# Altium footprint library 19-Resistors.PcbLib: 199 footprints (part 6 of 13)
Each footprint in its own frame and in the unit in brackets; x right, y up, seen from the top. Pads: shape width x height; smd on the part's side, far side on the other; paste and mask are expansions set on the pad; w line width, h text height; cw(c..) or ccw(c..) is an arc to the next point about the centre after c.
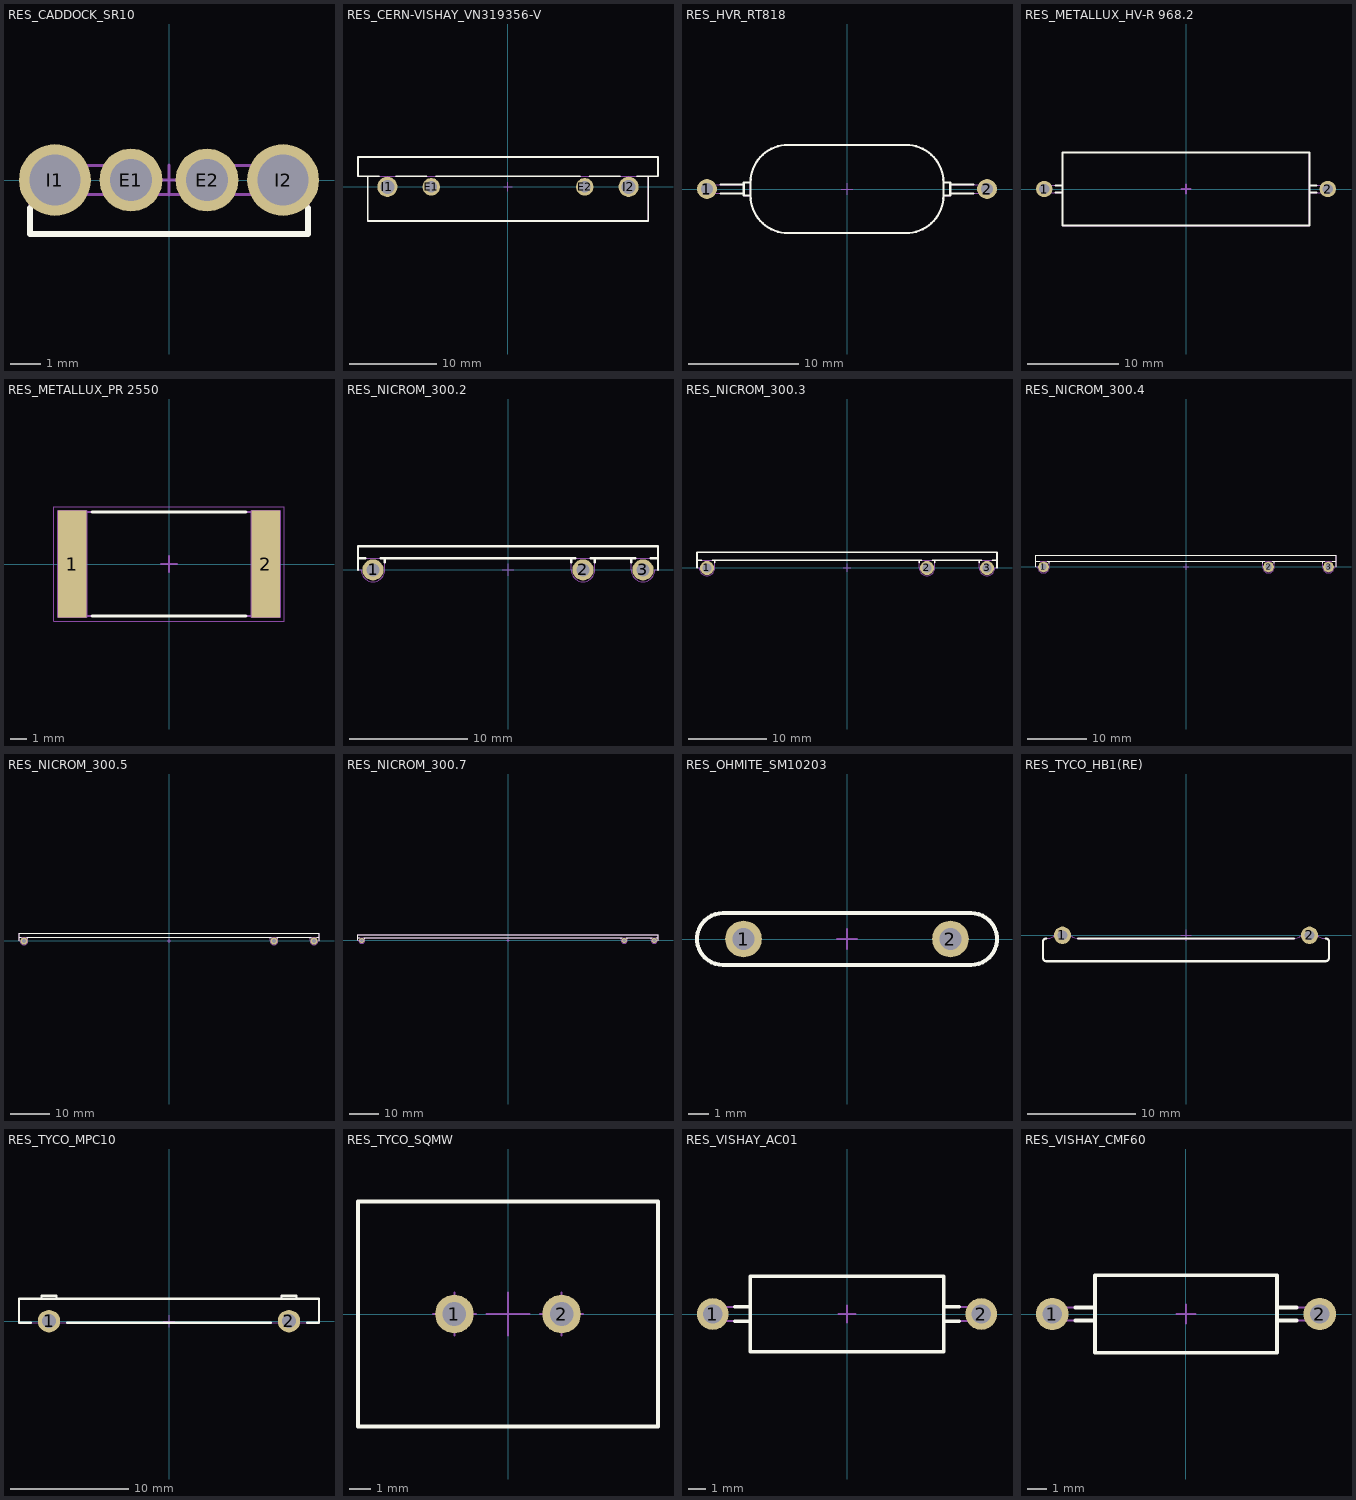
[diagram p5: the footprints below, top view; thin cyan lines are the x and y axes]

## RES_CADDOCK_SR10 [mm] "Precision Current Sense Resistor"
height 9.78
pads (4):
  round 2.1 hole 1.4: E1(-1.27,0) E2(1.27,0)
  round 2.4 hole 1.7: I1(-3.81,0) I2(3.81,0)
Top Overlay:
  lines w0.2: -4.635,-0.939 -4.635,-1.8 4.635,-1.8 4.635,-0.939
Mechanical 8:
  lines w0.1: -4.31,0 -3.81,0 ; -3.81,-0.5 -3.81,0 ; -3.81,0.5 -3.81,0 ; -3.31,0 -3.81,0 ; -1.77,0 -1.27,0 ; -1.27,-0.5 -1.27,0 ; -1.27,0.5 -1.27,0 ; -0.77,0 -1.27,0 ; -0.5,0 0,0 ; 0,-0.5 0,0 ; 0,0.5 0,0 ; 0.5,0 0,0 ; 0.77,0 1.27,0 ; 1.27,-0.5 1.27,0 ; 1.27,0.5 1.27,0 ; 1.77,0 1.27,0 ; 3.31,0 3.81,0 ; 3.81,-0.5 3.81,0 ; 3.81,0.5 3.81,0 ; 4.31,0 3.81,0
Mechanical 14:
  lines w0.1: -4.38,-0.49 -4.38,0.49 -0.95,0.49 -0.95,-0.49 ; 0.95,-0.49 0.95,0.49 4.38,0.49 4.38,-0.49 ; -4.635,-1.8 4.635,-1.8 4.635,-0.49 -4.635,-0.49 -4.635,-1.8
3D body "v200-130.stp": height 0.02, standoff -1.65, extent 2.81,-1 4.81,1
3D body "v200-130.stp": height 0.02, standoff -1.65, extent 0.27,-1 2.27,1
3D body "v200-130.stp": height 0.02, standoff -1.65, extent -2.27,-1 -0.27,1
3D body "v200-130.stp": height 0.02, standoff -1.65, extent -4.81,-1 -2.81,1
3D body "RES_CADDOCK_SR10.stp": height 9.87, standoff -3.6, extent -4.635,-1.8 4.635,0.49

## RES_CERN-VISHAY_VN319356-V [mm] "Custom Made Product VISHAY High Stability Precision Shunt Resistor"
height 25.2
pads (4):
  round 2 hole 1.3: E1(-8.75,0) E2(8.75,0)
  round 2.3 hole 1.6: I1(-13.75,0) I2(13.75,0)
Top Overlay:
  lines w0.2: -16,1.2 -16,-3.9 16,-3.9 16,1.2 ; -14.7,1.2 -17.1,1.2 -17.1,3.4 17.1,3.4 17.1,1.2 14.7,1.2 ; -12.8,1.2 -9.25,1.2 ; -8.25,1.2 8.25,1.2 ; 9.25,1.2 12.8,1.2
Mechanical 8:
  lines w0.1: -14.25,0 -13.75,0 ; -13.75,-0.5 -13.75,0 ; -13.75,0.5 -13.75,0 ; -13.25,0 -13.75,0 ; -9.25,0 -8.75,0 ; -8.75,-0.5 -8.75,0 ; -8.75,0.5 -8.75,0 ; -8.25,0 -8.75,0 ; -0.5,0 0,0 ; 0,-0.5 0,0 ; 0,0.5 0,0 ; 0.5,0 0,0 ; 8.25,0 8.75,0 ; 8.75,-0.5 8.75,0 ; 8.75,0.5 8.75,0 ; 9.25,0 8.75,0 ; 13.25,0 13.75,0 ; 13.75,-0.5 13.75,0 ; 13.75,0.5 13.75,0 ; 14.25,0 13.75,0
Mechanical 14:
  lines w0.1: -17.1,1.2 -17.1,3.4 17.1,3.4 17.1,1.2 -17.1,1.2 ; -16,-3.9 -16,1.2 16,1.2 16,-3.9 -16,-3.9
3D body "v200-130.stp": height 0.02, standoff -1.65, extent 12.75,-1 14.75,1
3D body "v200-130.stp": height 0.02, standoff -1.65, extent 7.75,-1 9.75,1
3D body "v200-130.stp": height 0.02, standoff -1.65, extent -9.75,-1 -7.75,1
3D body "v200-130.stp": height 0.02, standoff -1.65, extent -14.75,-1 -12.75,1
3D body "RES_CERN-VISHAY_VN319356-v.stp": height 25.2, standoff -3.8, extent -17.1,-3.9 17.1,3.4

## RES_HVR_RT818 [mm] "Resistor, Axial, Pad spacing 25.4mm - Body L 18.5mm X D 8mm Lead Diameter 0.812mm"
height 8
pads (2):
  round 1.8 hole 1.1: 1(-12.7,0) 2(12.7,0)
Top Overlay:
  lines w0.2: -11.465,-0.406 -9.365,-0.406 ; -11.465,0.406 -9.365,0.406 ; 9.365,-0.406 11.465,-0.406 ; 9.365,0.406 11.465,0.406 ; -8.75,-0.6 ccw(c-5.35,-0.6) -5.35,-4 5.35,-4 ccw(c5.35,-0.6) 8.75,-0.6 ; -8.75,-0.6 -9.365,-0.6 -9.365,0.6 -8.75,0.6 ; -8.75,-0.6 -8.75,0.6 ; -8.75,0.6 cw(c-5.35,0.6) -5.35,4 5.35,4 cw(c5.35,0.6) 8.75,0.6 ; 8.75,-0.6 9.365,-0.6 9.365,0.6 8.75,0.6 ; 8.75,-0.6 8.75,0.6
Mechanical 8:
  lines w0.1: -13.2,0 -12.7,0 ; -12.7,-0.5 -12.7,0 ; -12.7,0.5 -12.7,0 ; -12.2,0 -12.7,0 ; -0.5,0 0,0 ; 0,-0.5 0,0 ; 0,0.5 0,0 ; 0.5,0 0,0 ; 12.2,0 12.7,0 ; 12.7,-0.5 12.7,0 ; 12.7,0.5 12.7,0 ; 13.2,0 12.7,0
Mechanical 14:
  lines w0.1: -9.365,-0.406 -12.7,-0.406 cw(c-12.7,0) -12.7,0.406 -9.365,0.406 ; 9.365,-0.406 12.7,-0.406 ccw(c12.7,0) 12.7,0.406 9.365,0.406 ; -8.75,-0.6 ccw(c-5.35,-0.6) -5.35,-4 5.35,-4 ccw(c5.35,-0.6) 8.75,-0.6 ; -8.75,-0.6 -9.365,-0.6 -9.365,0.6 -8.75,0.6 ; -8.75,-0.6 -8.75,0.6 ; -8.75,0.6 cw(c-5.35,0.6) -5.35,4 5.35,4 cw(c5.35,0.6) 8.75,0.6 ; 8.75,-0.6 9.365,-0.6 9.365,0.6 8.75,0.6 ; 8.75,-0.6 8.75,0.6
3D body "v200-130.stp": height 0.02, standoff -1.65, extent 11.7,-1 13.7,1
3D body "v200-130.stp": height 0.02, standoff -1.65, extent -13.7,-1 -11.7,1
3D body "RES_HVR_RT818.stp": height 8, standoff -3.6, extent -13.106,-4 13.106,4

## RES_METALLUX_HV-R 968.2 [mm] "Resistor, Axial, Pad Spacing 31mm - Body Lengh 27mm X Body Diameter 8mm"
height 8
pads (2):
  round 1.8 hole 1.1: 1(-15.5,0) 2(15.5,0)
Top Overlay:
  lines w0.2: -14.275,-0.4 -13.5,-0.4 ; -14.275,0.4 -13.5,0.4 ; 13.5,-0.4 14.275,-0.4 ; 13.5,0.4 14.275,0.4 ; -13.5,-4 -13.5,4 13.5,4 13.5,-4 -13.5,-4
Mechanical 8:
  lines w0.2: -16,0 -15.5,0 ; -15.5,-0.5 -15.5,0 ; -15.5,0.5 -15.5,0 ; -15,0 -15.5,0 ; -0.5,0 0,0 ; 0,-0.5 0,0 ; 0,0.5 0,0 ; 0.5,0 0,0 ; 15,0 15.5,0 ; 15.5,-0.5 15.5,0 ; 15.5,0.5 15.5,0 ; 16,0 15.5,0
Mechanical 14:
  lines w0.1: -13.5,-0.4 -15.5,-0.4 cw(c-15.5,0) -15.5,0.4 -13.5,0.4 ; 13.5,-0.4 15.5,-0.4 ccw(c15.5,0) 15.5,0.4 13.5,0.4 ; -13.5,-4 -13.5,4 13.5,4 13.5,-4 -13.5,-4
3D body "v200-130.stp": height 0.02, standoff -1.65, extent 14.5,-1 16.5,1
3D body "v200-130.stp": height 0.02, standoff -1.65, extent -16.5,-1 -14.5,1
3D body "RES_METALLUX_HV-R 968.2.stp": height 8, standoff -3.6, extent -15.9,-4 15.9,4

## RES_METALLUX_PR 2550 [mm] "High Voltage Resistor SMD Resistor, 2-Leads, Body 12.7 x 6.35 mm, IPC Medium Density"
height 1.52
pads (2):
  rect 1.75x6.5 smd: 1(-5.9,0) 2(5.9,0)
Top Overlay:
  lines w0.2: -4.68,-3.175 4.68,-3.175 ; -4.68,3.175 4.68,3.175
Mechanical 8:
  lines w0.1: -6.4,0 -5.9,0 ; -5.9,-0.5 -5.9,0 ; -5.9,0.5 -5.9,0 ; -5.4,0 -5.9,0 ; -0.5,0 0,0 ; 0,-0.5 0,0 ; 0,0.5 0,0 ; 0.5,0 0,0 ; 5.4,0 5.9,0 ; 5.9,-0.5 5.9,0 ; 5.9,0.5 5.9,0 ; 6.4,0 5.9,0 ; -6.775,-3.25 -5.025,-3.25 -5.025,3.25 -6.775,3.25 -6.775,-3.25 ; 5.025,-3.25 6.775,-3.25 6.775,3.25 5.025,3.25 5.025,-3.25
Mechanical 14:
  lines w0.1: -6.35,-3.175 -6.35,3.175 ; -6.35,-3.175 -5.08,-3.175 -5.08,3.175 -6.35,3.175 ; -6.35,-3.175 6.35,-3.175 ; -6.35,-3.175 -6.35,3.175 ; -6.35,3.175 6.35,3.175 ; 6.35,-3.175 5.08,-3.175 5.08,3.175 6.35,3.175 ; 6.35,-3.175 6.35,3.175 ; 6.35,-3.175 6.35,3.175
Mechanical 15:
  lines w0.05: -7.025,-3.5 -7.025,3.5 7.025,3.5 7.025,-3.5 -7.025,-3.5
3D body "p650-175.stp": height 0.02, standoff 0, extent -6.8,-3.25 -5.05,3.25
3D body "p650-175.stp": height 0.02, standoff 0, extent 5.05,-3.25 6.8,3.25
3D body "RES_METALLUX_PR 2550.stp": height 1.52, standoff 0, extent -6.35,-3.175 6.35,3.175

## RES_NICROM_300.2 [mm] "High Voltage Divider NICROM 300.2"
height 7.62
pads (3):
  round 1.8 hole 1.1: 1(-11.43,0) 2(6.35,0) 3(11.43,0)
Top Overlay:
  lines w0.2: -12.7,0 -12.7,1 ; -12.093,1 -12.7,1 ; -10.767,1 5.687,1 ; -10.43,0.663 -10.43,1 ; 5.35,0.663 5.35,1 ; 7.013,1 10.767,1 ; 7.35,0.663 7.35,1 ; 10.43,0.663 10.43,1 ; 12.093,1 12.7,1 ; 12.7,0 12.7,1 ; -12.7,1 -12.7,2 ; -12.7,1 -12.7,2 ; -12.7,2 12.7,2 12.7,1
Mechanical 8:
  lines w0.1: -11.93,0 -11.43,0 ; -11.43,-0.5 -11.43,0 ; -11.43,0.5 -11.43,0 ; -10.93,0 -11.43,0 ; -0.5,0 0,0 ; 0,-0.5 0,0 ; 0,0.5 0,0 ; 0.5,0 0,0 ; 5.85,0 6.35,0 ; 6.35,-0.5 6.35,0 ; 6.35,0.5 6.35,0 ; 6.85,0 6.35,0 ; 10.93,0 11.43,0 ; 11.43,-0.5 11.43,0 ; 11.43,0.5 11.43,0 ; 11.93,0 11.43,0
Mechanical 14:
  lines w0.1: -10.43,1 -10.43,0 cw(c-11.43,0) -12.43,0 ; 5.35,1 5.35,0 ccw(c6.35,0) 7.35,0 7.35,1 ; 10.43,1 10.43,0 ccw(c11.43,0) 12.43,0 12.7,0 12.7,1 ; -12.7,0 -12.43,0 ; -12.7,0 -12.7,1 ; -12.7,0 -12.43,0 ; -12.7,1 -12.7,2 12.7,2 12.7,1 ; -12.7,1 12.7,1
3D body "v200-130.stp": height 0.02, standoff -1.65, extent 10.43,-1 12.43,1
3D body "v200-130.stp": height 0.02, standoff -1.65, extent 5.35,-1 7.35,1
3D body "v200-130.stp": height 0.02, standoff -1.65, extent -12.43,-1 -10.43,1
3D body "RES_NICROM_300.2.stp": height 12.62, standoff -3.6, extent -12.7,-1 12.7,2

## RES_NICROM_300.3 [mm] "High Voltage Divider NICROM 300.3"
height 12.7
pads (3):
  round 1.8 hole 1.1: 1(-17.78,0) 2(10.16,0) 3(17.78,0)
Top Overlay:
  lines w0.2: -19.05,0 -19.05,1 ; -18.443,1 -19.05,1 ; -17.117,1 9.497,1 ; -16.78,0.663 -16.78,1 ; 9.16,0.663 9.16,1 ; 10.823,1 17.117,1 ; 11.16,0.663 11.16,1 ; 16.78,0.663 16.78,1 ; 18.443,1 19.05,1 ; 19.05,0 19.05,1 ; -19.05,1 -19.05,2 ; -19.05,1 -19.05,2 ; -19.05,2 19.05,2 19.05,1
Mechanical 8:
  lines w0.1: -18.28,0 -17.78,0 ; -17.78,-0.5 -17.78,0 ; -17.78,0.5 -17.78,0 ; -17.28,0 -17.78,0 ; -0.5,0 0,0 ; 0,-0.5 0,0 ; 0,0.5 0,0 ; 0.5,0 0,0 ; 9.66,0 10.16,0 ; 10.16,-0.5 10.16,0 ; 10.16,0.5 10.16,0 ; 10.66,0 10.16,0 ; 17.28,0 17.78,0 ; 17.78,-0.5 17.78,0 ; 17.78,0.5 17.78,0 ; 18.28,0 17.78,0
Mechanical 14:
  lines w0.1: -16.78,1 -16.78,0 cw(c-17.78,0) -18.78,0 ; 9.16,1 9.16,0 ccw(c10.16,0) 11.16,0 11.16,1 ; 16.78,1 16.78,0 ccw(c17.78,0) 18.78,0 19.05,0 19.05,1 ; -19.05,0 -18.78,0 ; -19.05,0 -19.05,1 ; -19.05,0 -18.78,0 ; -19.05,1 -19.05,2 ; -19.05,1 -19.05,2 ; -19.05,1 19.05,1 ; -19.05,2 19.05,2 ; 19.05,1 19.05,2 ; 19.05,1 19.05,2
3D body "v200-130.stp": height 0.02, standoff -1.65, extent 16.78,-1 18.78,1
3D body "v200-130.stp": height 0.02, standoff -1.65, extent 9.16,-1 11.16,1
3D body "v200-130.stp": height 0.02, standoff -1.65, extent -18.78,-1 -16.78,1
3D body "RES_NICROM_300.3.stp": height 17.7, standoff -3.6, extent -19.05,-1 19.05,2

## RES_NICROM_300.4 [mm] "High Voltage Divider NICROM 300.4"
height 15.24
pads (3):
  round 1.8 hole 1.1: 1(-24.13,0) 2(13.97,0) 3(24.13,0)
Top Overlay:
  lines w0.2: -25.4,0 -25.4,1 ; -24.793,1 -25.4,1 ; -23.467,1 13.307,1 ; -23.13,0.663 -23.13,1 ; 12.97,0.663 12.97,1 ; 14.633,1 23.467,1 ; 14.97,0.663 14.97,1 ; 23.13,0.663 23.13,1 ; 24.793,1 25.4,1 ; 25.4,0 25.4,1 ; -25.4,1 -25.4,2 ; -25.4,1 -25.4,2 ; -25.4,2 25.4,2 25.4,1
Mechanical 8:
  lines w0.1: -24.63,0 -24.13,0 ; -24.13,-0.5 -24.13,0 ; -24.13,0.5 -24.13,0 ; -23.63,0 -24.13,0 ; -0.5,0 0,0 ; 0,-0.5 0,0 ; 0,0.5 0,0 ; 0.5,0 0,0 ; 13.47,0 13.97,0 ; 13.97,-0.5 13.97,0 ; 13.97,0.5 13.97,0 ; 14.47,0 13.97,0 ; 23.63,0 24.13,0 ; 24.13,-0.5 24.13,0 ; 24.13,0.5 24.13,0 ; 24.63,0 24.13,0
Mechanical 14:
  lines w0.1: -23.13,1 -23.13,0 cw(c-24.13,0) -25.13,0 ; 12.97,1 12.97,0 ccw(c13.97,0) 14.97,0 14.97,1 ; 23.13,1 23.13,0 ccw(c24.13,0) 25.13,0 25.4,0 25.4,1 ; -25.4,0 -25.13,0 ; -25.4,0 -25.4,1 ; -25.4,0 -25.13,0 ; -25.4,1 -25.4,2 ; -25.4,1 -25.4,2 ; -25.4,1 25.4,1 ; -25.4,2 25.4,2 ; 25.4,1 25.4,2 ; 25.4,1 25.4,2
3D body "v200-130.stp": height 0.02, standoff -1.65, extent 23.13,-1 25.13,1
3D body "v200-130.stp": height 0.02, standoff -1.65, extent 12.97,-1 14.97,1
3D body "v200-130.stp": height 0.02, standoff -1.65, extent -25.13,-1 -23.13,1
3D body "RES_NICROM_300.4.stp": height 20.24, standoff -3.6, extent -25.4,-0.992 25.4,2

## RES_NICROM_300.5 [mm] "High Voltage Divider NICROM 300.5"
height 15.24
pads (3):
  round 1.8 hole 1.1: 1(-36.83,0) 2(26.67,0) 3(36.83,0)
Top Overlay:
  lines w0.2: -38.1,0 -38.1,1 ; -37.493,1 -38.1,1 ; -36.167,1 26.007,1 ; -35.83,0.663 -35.83,1 ; 25.67,0.663 25.67,1 ; 27.333,1 36.167,1 ; 27.67,0.663 27.67,1 ; 35.83,0.663 35.83,1 ; 37.493,1 38.1,1 ; 38.1,0 38.1,1 ; -38.1,1 -38.1,2 ; -38.1,1 -38.1,2 ; -38.1,2 38.1,2 38.1,1
Mechanical 8:
  lines w0.1: -37.33,0 -36.83,0 ; -36.83,-0.5 -36.83,0 ; -36.83,0.5 -36.83,0 ; -36.33,0 -36.83,0 ; -0.5,0 0,0 ; 0,-0.5 0,0 ; 0,0.5 0,0 ; 0.5,0 0,0 ; 26.17,0 26.67,0 ; 26.67,-0.5 26.67,0 ; 26.67,0.5 26.67,0 ; 27.17,0 26.67,0 ; 36.33,0 36.83,0 ; 36.83,-0.5 36.83,0 ; 36.83,0.5 36.83,0 ; 37.33,0 36.83,0
Mechanical 14:
  lines w0.1: -35.83,1 -35.83,0 cw(c-36.83,0) -37.83,0 ; 25.67,1 25.67,0 ccw(c26.67,0) 27.67,0 27.67,1 ; 35.83,1 35.83,0 ccw(c36.83,0) 37.83,0 38.1,0 38.1,1 ; -38.1,0 -37.83,0 ; -38.1,0 -38.1,1 ; -38.1,0 -37.83,0 ; -38.1,1 38.1,1 ; -38.1,1 -38.1,2 ; -38.1,1 -38.1,2 ; -38.1,2 38.1,2 ; 38.1,1 38.1,2 ; 38.1,1 38.1,2
3D body "v200-130.stp": height 0.02, standoff -1.65, extent 35.83,-1 37.83,1
3D body "v200-130.stp": height 0.02, standoff -1.65, extent 25.67,-1 27.67,1
3D body "v200-130.stp": height 0.02, standoff -1.65, extent -37.83,-1 -35.83,1
3D body "RES_NICROM_300.5.stp": height 20.24, standoff -3.6, extent -38.1,-1 38.1,2

## RES_NICROM_300.7 [mm] "High Voltage Divider NICROM 300.7"
height 15.24
pads (3):
  round 1.8 hole 1.1: 1(-49.53,0) 2(39.37,0) 3(49.53,0)
Top Overlay:
  lines w0.2: -50.8,0 -50.8,1 ; -50.193,1 -50.8,1 ; -48.867,1 38.707,1 ; -48.53,0.663 -48.53,1 ; 38.37,0.663 38.37,1 ; 40.033,1 48.867,1 ; 40.37,0.663 40.37,1 ; 48.53,0.663 48.53,1 ; 50.193,1 50.8,1 ; 50.8,0 50.8,1 ; -50.8,1 -50.8,2 ; -50.8,1 -50.8,2 ; -50.8,2 50.8,2 50.8,1
Mechanical 8:
  lines w0.1: -50.03,0 -49.53,0 ; -49.53,-0.5 -49.53,0 ; -49.53,0.5 -49.53,0 ; -49.03,0 -49.53,0 ; -0.5,0 0,0 ; 0,-0.5 0,0 ; 0,0.5 0,0 ; 0.5,0 0,0 ; 38.87,0 39.37,0 ; 39.37,-0.5 39.37,0 ; 39.37,0.5 39.37,0 ; 39.87,0 39.37,0 ; 49.03,0 49.53,0 ; 49.53,-0.5 49.53,0 ; 49.53,0.5 49.53,0 ; 50.03,0 49.53,0
Mechanical 14:
  lines w0.1: -48.53,1 -48.53,0 cw(c-49.53,0) -50.53,0 ; 38.37,1 38.37,0 ccw(c39.37,0) 40.37,0 40.37,1 ; 48.53,1 48.53,0 ccw(c49.53,0) 50.53,0 50.8,0 50.8,1 ; -50.8,0 -50.53,0 ; -50.8,0 -50.8,1 ; -50.8,0 -50.53,0 ; -50.8,1 50.8,1 ; -50.8,1 -50.8,2 ; -50.8,1 -50.8,2 ; -50.8,2 50.8,2 ; 50.8,1 50.8,2 ; 50.8,1 50.8,2
3D body "v200-130.stp": height 0.02, standoff -1.65, extent 48.53,-1 50.53,1
3D body "v200-130.stp": height 0.02, standoff -1.65, extent 38.37,-1 40.37,1
3D body "v200-130.stp": height 0.02, standoff -1.65, extent -50.425,-0.95 -48.425,1.05
3D body "RES_NICROM_300.7.stp": height 20.24, standoff -3.6, extent -50.8,-1 50.8,2

## RES_OHMITE_SM10203 [mm] "Resistor, Radial, Pad spacing 10.16mm - Body 14.73mm X 2.54mm X 8.64mm H"
height 8.64
pads (2):
  round 1.8 hole 1.1: 1(-5.08,0) 2(5.08,0)
Top Overlay:
  lines w0.2: -6.095,-1.27 cw(c-6.095,0) -6.095,1.27 6.095,1.27 cw(c6.095,0) 6.095,-1.27 -6.095,-1.27
Mechanical 8:
  lines w0.1: -5.58,0 -5.08,0 ; -5.08,-0.5 -5.08,0 ; -5.08,0.5 -5.08,0 ; -4.58,0 -5.08,0 ; -0.5,0 0,0 ; 0,-0.5 0,0 ; 0,0.5 0,0 ; 0.5,0 0,0 ; 4.58,0 5.08,0 ; 5.08,-0.5 5.08,0 ; 5.08,0.5 5.08,0 ; 5.58,0 5.08,0
Mechanical 14:
  lines w0.1: -6.095,-1.27 cw(c-6.095,0) -6.095,1.27 6.095,1.27 cw(c6.095,0) 6.095,-1.27 -6.095,-1.27
3D body "v200-130.stp": height 0.02, standoff -1.65, extent 4.08,-1 6.08,1
3D body "v200-130.stp": height 0.02, standoff -1.65, extent -6.08,-1 -4.08,1
3D body "RES_OHMITE_SM10203.stp": height 9.14, standoff -3.6, extent -7.365,-1.27 7.365,1.27

## RES_TYCO_HB1(RE) [mm] "Resistor, Radial, Leads spacing 22.9mm - Body 26.5mm X 3mm X 10.4mm H"
height 10.4
pads (2):
  round 1.6 hole 0.9: 1(-11.45,0) 2(11.45,0)
Top Overlay:
  lines w0.2: -12.95,-0.3 ccw(c-12.95,-0.6) -13.25,-0.6 -13.25,-2.1 ccw(c-12.95,-2.1) -12.95,-2.4 12.95,-2.4 ccw(c12.95,-2.1) 13.25,-2.1 13.25,-0.6 ccw(c12.95,-0.6) 12.95,-0.3 ; -10.011,-0.3 10.011,-0.3
Mechanical 8:
  lines w0.1: -11.95,0 -11.45,0 ; -11.45,-0.5 -11.45,0 ; -11.45,0.5 -11.45,0 ; -10.95,0 -11.45,0 ; -0.5,0 0,0 ; 0,-0.5 0,0 ; 0,0.5 0,0 ; 0.5,0 0,0 ; 10.95,0 11.45,0 ; 11.45,-0.5 11.45,0 ; 11.45,0.5 11.45,0 ; 11.95,0 11.45,0
Mechanical 14:
  lines w0.1: 11.983,0.259 ccw(c11.446,0.007) 10.91,0.263 cw(c10.011,0.7) 10.011,-0.3 -10.011,-0.3 cw(c-10.011,0.7) -10.91,0.263 ccw(c-11.45,0) -11.99,0.263 cw(c-12.893,0.704) -12.95,-0.3 ccw(c-12.95,-0.6) -13.25,-0.6 -13.25,-2.1 ccw(c-12.95,-2.1) -12.95,-2.4 12.95,-2.4 ccw(c12.95,-2.1) 13.25,-2.1 13.25,-0.6 ccw(c12.95,-0.6) 12.95,-0.3 cw(c12.893,0.704) 11.99,0.263
3D body "v200-130.stp": height 0.02, standoff -1.65, extent 10.45,-1 12.45,1
3D body "v200-130.stp": height 0.02, standoff -1.65, extent -12.45,-1 -10.45,1
3D body "RES_TYCO_HB1(RE).stp": height 18.4, standoff -2.1, extent -13.25,-2.4 13.25,0.6

## RES_TYCO_MPC10 [mm] "Resistor, Radial, Leads spacing 20.32mm - Body 25.4mm X 2.54mm X 27.68mm H"
height 27.68
pads (2):
  round 1.9 hole 1.2: 1(-10.16,0) 2(10.16,0)
Top Overlay:
  lines w0.2: -11.705,-0.127 -12.7,-0.127 -12.7,1.905 12.7,1.905 12.7,-0.127 11.705,-0.127 ; -10.795,1.905 -10.795,2.159 -9.525,2.159 -9.525,1.905 ; -8.615,-0.127 8.615,-0.127 ; 9.525,1.905 9.525,2.159 10.795,2.159 10.795,1.905
Mechanical 8:
  lines w0.1: -10.66,0 -10.16,0 ; -10.16,-0.5 -10.16,0 ; -10.16,0.5 -10.16,0 ; -9.66,0 -10.16,0 ; -0.5,0 0,0 ; 0,-0.5 0,0 ; 0,0.5 0,0 ; 0.5,0 0,0 ; 9.66,0 10.16,0 ; 10.16,-0.5 10.16,0 ; 10.16,0.5 10.16,0 ; 10.66,0 10.16,0
Mechanical 14:
  lines w0.1: -10.795,-0.127 -10.795,-0.381 -9.525,-0.381 -9.525,-0.127 ; -10.795,1.905 -10.795,2.159 -9.525,2.159 -9.525,1.905 ; 9.525,-0.127 9.525,-0.381 10.795,-0.381 10.795,-0.127 ; 9.525,1.905 9.525,2.159 10.795,2.159 10.795,1.905 ; -12.7,-0.127 -12.7,1.905 12.7,1.905 12.7,-0.127 -12.7,-0.127
3D body "v200-130.stp": height 0.02, standoff -1.65, extent 9.16,-1 11.16,1
3D body "v200-130.stp": height 0.02, standoff -1.65, extent -11.16,-1 -9.16,1
3D body "RES_TYCO_MPC10.stp": height 27.68, standoff -3.17, extent -12.7,-0.381 12.7,2.159

## RES_TYCO_SQMW [mm] "Resistor, Radial, Pad spacing 5mm - Body 14mm X 10.5mm X 40mm H"
height 40
pads (2):
  round 1.8 hole 1.1: 1(-2.5,0) 2(2.5,0)
Top Overlay:
  lines w0.2: -7,-5.25 7,-5.25 7,5.25 -7,5.25 -7,-5.25
Mechanical 8:
  lines w0.1: -3.5,0 -2.5,0 ; -2.5,-1 -2.5,0 ; -2.5,1 -2.5,0 ; -1.5,0 -2.5,0 ; -1,0 0,0 ; 0,-1 0,0 ; 0,1 0,0 ; 1,0 0,0 ; 1.5,0 2.5,0 ; 2.5,-1 2.5,0 ; 2.5,1 2.5,0 ; 3.5,0 2.5,0
Mechanical 14:
  lines w0.1: -7,-5.25 7,-5.25 7,5.25 -7,5.25 -7,-5.25
3D body "v200-130.stp": height 0.02, standoff -1.65, extent 1.5,-1 3.5,1
3D body "v200-130.stp": height 0.02, standoff -1.65, extent -3.5,-1 -1.5,1
3D body "RES_TYCO_SQMW.stp": height 40, standoff -3.5, extent -7,-5.25 7,5.25

## RES_VISHAY_AC01 [mm] "Resistor, Axial, Pad spacing 15.24 mm - Body Lengh 11mm X Body Diameter 4.3mm"
height 4.3
pads (2):
  round 1.8 hole 1.1: 1(-7.62,0) 2(7.62,0)
Top Overlay:
  lines w0.2: -6.383,-0.4 -5.5,-0.4 ; -6.383,0.4 -5.5,0.4 ; 5.5,-0.4 6.383,-0.4 ; 5.5,0.4 6.383,0.4 ; -5.5,-2.15 5.5,-2.15 5.5,2.15 -5.5,2.15 -5.5,-2.15
Mechanical 8:
  lines w0.1: -8.12,0 -7.62,0 ; -7.62,-0.5 -7.62,0 ; -7.62,0.5 -7.62,0 ; -7.12,0 -7.62,0 ; -0.5,0 0,0 ; 0,-0.5 0,0 ; 0,0.5 0,0 ; 0.5,0 0,0 ; 7.12,0 7.62,0 ; 7.62,-0.5 7.62,0 ; 7.62,0.5 7.62,0 ; 8.12,0 7.62,0
Mechanical 14:
  lines w0.1: -5.5,-0.4 -7.62,-0.4 cw(c-7.62,0) -7.62,0.4 -5.5,0.4 ; 5.5,-0.4 7.62,-0.4 ccw(c7.62,0) 7.62,0.4 5.5,0.4 ; -5.5,-2.15 5.5,-2.15 5.5,2.15 -5.5,2.15 -5.5,-2.15
3D body "v200-130.stp": height 0.02, standoff -1.65, extent 6.62,-1 8.62,1
3D body "v200-130.stp": height 0.02, standoff -1.65, extent -8.62,-1 -6.62,1
3D body "RES_VISHAY_AC01.stp": height 4.3, standoff -3.8, extent -8.02,-2.15 8.02,2.15

## RES_VISHAY_CMF60 [mm] "Resistor, Axial, Pad spacing 13 mm - Body Lengh 8.74mm X Body Diameter 3.68mm"
height 4.06
pads (2):
  round 1.7 hole 1: 1(-7,0) 2(7,0)
Top Overlay:
  lines w0.2: -5.799,-0.345 -4.765,-0.345 ; -5.799,0.345 -4.765,0.345 ; 4.765,-0.345 5.799,-0.345 ; 4.765,0.345 5.799,0.345 ; -4.765,-2.03 4.765,-2.03 4.765,2.03 -4.765,2.03 -4.765,-2.03
Mechanical 8:
  lines w0.1: -7.5,0 -7,0 ; -7,-0.5 -7,0 ; -7,0.5 -7,0 ; -6.5,0 -7,0 ; -0.5,0 0,0 ; 0,-0.5 0,0 ; 0,0.5 0,0 ; 0.5,0 0,0 ; 6.5,0 7,0 ; 7,-0.5 7,0 ; 7,0.5 7,0 ; 7.5,0 7,0
Mechanical 14:
  lines w0.1: -4.765,-0.345 -7,-0.345 cw(c-7,0) -7,0.345 -4.765,0.345 ; 4.765,-0.345 7,-0.345 ccw(c7,0) 7,0.345 4.765,0.345 ; -4.765,-2.03 4.765,-2.03 4.765,2.03 -4.765,2.03 -4.765,-2.03
3D body "v200-130.stp": height 0.02, standoff -1.65, extent 6,-1 8,1
3D body "v200-130.stp": height 0.02, standoff -1.65, extent -8,-1 -6,1
3D body "RES_VISHAY_CMF60.stp": height 4.06, standoff -3.6, extent -7.345,-2.03 7.345,2.03